# Altium footprint library HARTING THD.PcbLib: 113 footprints (part 1 of 11) (continued)
## HARTING_02 07 160 1101 [mm] "Extender Card Female Connector; Har-bus 64, 17mm Pres-in Terminations; Rows z+a+b+c+d, 160 Female Contacts" (continued)
  round 3.5 / inner round 3.5 / far side round 5.1 hole 2.8: MTG1(0,5.08) MTG2(0,-83.82)
Top Overlay:
  lines w0.2: -6.4,-83.82 -2.944,-83.82 -2.652,-83.314 ; -6.4,-80.77 -6.4,-86.37 -0.887,-86.37 ; -6.4,1.53 -6.4,7.63 -0.887,7.63 ; -6.4,5.08 -2.944,5.08 -2.652,4.574 ; -1.765,-81.777 -1.472,-81.27 -0.887,-81.27 ; -1.765,3.036 -1.472,2.53 -0.887,2.53 ; 0.887,-86.37 12.6,-86.37 ; 0.887,-81.27 1.472,-81.27 1.765,-81.777 ; 0.887,2.53 1.472,2.53 1.765,3.036 ; 0.887,7.63 12.6,7.63 ; 1.25,-80.77 1.25,2.03 12.6,2.03 ; 1.25,1.53 -12.6,1.53 -12.6,-80.77 12.6,-80.77 ; 2.579,-83.02 2.9,-83.02 2.9,-82.57 4.1,-81.37 4.1,-80.77 ; 2.579,4.28 2.9,4.28 2.9,3.83 4.1,2.63 4.1,2.03 ; 12,-80.77 12,2.03 ; 12.6,-81.87 25.57,-81.87 26.2,-81.24 26.2,2.5 25.57,3.13 12.6,3.13 ; 14.6,-86.67 12.6,-86.67 12.6,7.93 14.6,7.93 ; 15.1,-81.87 15.1,3.13 ; 16.55,-81.87 16.55,3.13 ; 18.5,-82.27 18.504,-82.27 cw(c18.504,-82.97) 19.204,-82.97 19.204,-84.37 ; 18.5,-81.87 18.5,-84.37 19.65,-84.37 19.65,-86.82 14.6,-86.82 14.6,8.08 19.65,8.08 19.65,5.63 18.5,5.63 18.5,3.13 ; 18.503,3.53 ccw(c18.503,4.23) 19.203,4.23 19.203,5.63 ; 25.9,-81.54 25.9,2.8
  text "d" at -10.705,2.175 h1.2
  text "c" at -8.13,2.2 h1.2
  text "1" at -13.8,-79.315 h1.2
  text "a" at -3.365,2.215 h1.2
  text "b" at -5.53,2.225 h1.2
  text "32" at -15.33,-0.615 h1.2
  text "5" at -14.255,-69.195 h1.2
  text "10" at -15.125,-56.505 h1.2
  text "15" at -15.125,-43.805 h1.2
  text "20" at -15.305,-31.115 h1.2
  text "25" at -15.355,-18.39 h1.2
  text "30" at -15.305,-5.69 h1.2
Mechanical 8:
  lines w0.1: -10.66,-78.74 -10.16,-78.74 ; -10.66,0 -10.16,0 ; -10.16,-79.24 -10.16,-78.74 ; -10.16,-78.24 -10.16,-78.74 ; -10.16,-0.5 -10.16,0 ; -10.16,0.5 -10.16,0 ; -9.66,-78.74 -10.16,-78.74 ; -9.66,0 -10.16,0 ; -8.12,-78.74 -7.62,-78.74 ; -8.12,0 -7.62,0 ; -7.62,-79.24 -7.62,-78.74 ; -7.62,-78.24 -7.62,-78.74 ; -7.62,-0.5 -7.62,0 ; -7.62,0.5 -7.62,0 ; -7.12,-78.74 -7.62,-78.74 ; -7.12,0 -7.62,0 ; -5.58,-78.74 -5.08,-78.74 ; -5.58,0 -5.08,0 ; -5.434,-39.724 -5.08,-39.37 ; -5.434,-39.016 -5.08,-39.37 ; -5.08,-79.24 -5.08,-78.74 ; -5.08,-78.24 -5.08,-78.74 ; -5.08,-0.5 -5.08,0 ; -5.08,0.5 -5.08,0 ; -4.726,-39.724 -5.08,-39.37 ; -4.726,-39.016 -5.08,-39.37 ; -4.58,-78.74 -5.08,-78.74 ; -4.58,0 -5.08,0 ; -3.04,-78.74 -2.54,-78.74 ; -3.04,0 -2.54,0 ; -2.54,-79.24 -2.54,-78.74 ; -2.54,-78.24 -2.54,-78.74 ; -2.54,-0.5 -2.54,0 ; -2.54,0.5 -2.54,0 ; -2.04,-78.74 -2.54,-78.74 ; -2.04,0 -2.54,0 ; -0.5,-83.82 0,-83.82 ; -0.5,-78.74 0,-78.74 ; -0.5,0 0,0 ; -0.5,5.08 0,5.08 ; 0,-84.32 0,-83.82 ; 0,-83.32 0,-83.82 ; 0,-79.24 0,-78.74 ; 0,-78.24 0,-78.74 ; 0,-0.5 0,0 ; 0,0.5 0,0 ; 0,4.58 0,5.08 ; 0,5.58 0,5.08 ; 0.5,-83.82 0,-83.82 ; 0.5,-78.74 0,-78.74 ; 0.5,0 0,0 ; 0.5,5.08 0,5.08 ; 2.76,-88.82 2.76,-39.37 2.76,10.08
Mechanical 14:
  circle w0.1: c0,-83.82 r1.25
  circle w0.1: c0,5.08 r1.25
  lines w0.1: -6.4,-83.82 -2.944,-83.82 -1.472,-81.27 1.472,-81.27 2.483,-83.02 2.9,-83.02 2.9,-82.57 4.1,-81.37 4.1,-80.77 ; -6.4,5.08 -2.944,5.08 -1.472,2.53 1.472,2.53 2.483,4.28 2.9,4.28 2.9,3.83 4.1,2.63 4.1,2.03 ; 1.25,-80.77 1.25,2.03 12.6,2.03 ; 1.25,1.53 -12.6,1.53 -12.6,-80.77 12.6,-80.77 ; 12,-80.77 12,2.03 ; 12.6,-86.37 -6.4,-86.37 -6.4,7.63 12.6,7.63 ; 12.6,-81.87 25.57,-81.87 26.2,-81.24 26.2,2.5 25.57,3.13 12.6,3.13 ; 14.6,-86.67 12.6,-86.67 12.6,7.93 14.6,7.93 ; 15.1,-81.87 15.1,3.13 ; 16.55,-81.87 16.55,3.13 ; 18.5,-82.27 18.504,-82.27 cw(c18.504,-82.97) 19.204,-82.97 19.204,-84.37 ; 18.5,-81.87 18.5,-84.37 19.65,-84.37 19.65,-86.82 14.6,-86.82 14.6,8.08 19.65,8.08 19.65,5.63 18.5,5.63 18.5,3.13 ; 18.503,3.53 ccw(c18.503,4.23) 19.203,4.23 19.203,5.63 ; 25.9,-81.54 25.9,2.8
  text "d" at -10.705,2.175 h1.2
  text "c" at -8.13,2.2 h1.2
  text "1" at -13.8,-79.315 h1.2
  text "z" at 1.7,-0.375 h1.2
  text "a" at -3.365,2.215 h1.2
  text "b" at -5.53,2.225 h1.2
  text "32" at -15.33,-0.615 h1.2
  text "5" at -14.255,-69.195 h1.2
  text "10" at -15.125,-56.505 h1.2
  text "15" at -15.125,-43.805 h1.2
  text "20" at -15.305,-31.115 h1.2
  text "25" at -15.355,-18.39 h1.2
  text "30" at -15.305,-5.69 h1.2
3D body "HARTING_02 07 160 1101.stp": height 11.95, standoff -4.05, extent -12.6,-86.82 26.2,8.08

## HARTING_02 44 000 0001 [mm] "Backplane Connector; Har-bus 64, Thru-Hole; Rows z+a+b+c+d, Press-in 160 Female Contacts"
height 15.5
Top Overlay:
  lines w0.2: -7.7,0.02 -6.9,0.02 ; -7.7,78.72 -6.9,78.72 ; -4.55,81.97 -4.55,86.87 ; -3,-8.13 -3,-0.53 2.4,-0.53 2.4,-8.13 ; -3,-7.549 -3.712,-7.549 -3.712,-4.711 -3,-4.711 ; -3,-3.23 -6.9,-3.23 -6.9,81.97 -3,81.97 ; -3,81.28 -3,86.87 ; -3,83.451 -3.712,83.451 -3.712,86.289 -3,86.289 ; -1.905,-8.13 -7.7,-8.13 -7.7,86.87 -1.905,86.87 ; 1.905,-8.13 7.7,-8.13 7.7,86.87 1.905,86.87 ; 2.4,-7.549 3.112,-7.549 3.109,-4.713 2.4,-4.711 ; 2.4,-3.23 4.4,-3.23 4.4,-2.23 6.9,-2.23 6.9,80.97 6.5,80.97 ; 2.4,81.28 2.4,86.87 ; 2.4,81.97 4.4,81.97 4.4,80.97 ; 2.4,83.451 3.112,83.451 3.103,86.281 2.4,86.281 ; 3.95,81.97 3.95,86.87 ; 6.9,0.02 7.7,0.02 ; 6.9,78.72 7.7,78.72
  text "5" at -9.17,9.485 h1.2
  text "b" at -0.425,79.915 h1.2
  text "a" at -3.14,79.905 h1.2
  text "z" at -5.725,79.89 h1.2
  text "c" at 2.275,79.94 h1.2
  text "d" at 5.15,79.915 h1.2
  text "30" at -10.6,73.025 h1.2
  text "25" at -10.6,60.325 h1.2
  text "20" at -10.6,47.625 h1.2
  text "15" at -10.6,34.925 h1.2
  text "10" at -10.6,22.225 h1.2
  text "32" at -10.6,78.105 h1.2
  text "1" at -9.07,-0.675 h1.2
Mechanical 8:
  lines w0.1: -1.3,-5.63 -0.3,-5.63 ; -1.3,84.37 -0.3,84.37 ; -0.5,0 0,0 ; -0.3,-6.63 -0.3,-5.63 ; -0.3,-4.63 -0.3,-5.63 ; -0.3,83.37 -0.3,84.37 ; -0.3,85.37 -0.3,84.37 ; 0,-0.5 0,0 ; 0,0.5 0,0 ; 0.5,0 0,0 ; 0.7,-5.63 -0.3,-5.63 ; 0.7,84.37 -0.3,84.37
Mechanical 14:
  lines w0.1: -7.7,0.02 -6.9,0.02 ; -7.7,78.72 -6.9,78.72 ; -4.55,81.97 -4.55,86.87 ; -3,-8.13 -3,-0.53 2.4,-0.53 2.4,-8.13 ; -3,-7.549 -3.712,-7.549 -3.712,-4.711 -3,-4.711 ; -3,-3.23 -6.9,-3.23 -6.9,81.97 -3,81.97 ; -3,83.451 -3.712,83.451 -3.712,86.289 -3,86.289 ; -3,85.87 2.4,85.87 ; -3,86.87 -3,79.27 2.4,79.27 2.4,86.87 ; 2.4,-7.549 3.112,-7.549 3.109,-4.713 2.4,-4.711 ; 2.4,-3.23 4.4,-3.23 4.4,-2.23 6.9,-2.23 6.9,80.97 4.4,80.97 4.4,81.97 2.4,81.97 ; 2.4,83.451 3.112,83.451 3.103,86.281 2.4,86.281 ; 3.95,81.97 3.95,86.87 ; 6.9,0.02 7.7,0.02 ; 6.9,78.72 7.7,78.72 ; -7.7,-8.13 7.7,-8.13 7.7,86.87 -7.7,86.87 -7.7,-8.13
  text "5" at -9.17,9.485 h1.2
  text "d" at 5.15,79.915 h1.2
  text "c" at 2.275,79.94 h1.2
  text "z" at -5.725,79.89 h1.2
  text "a" at -3.14,79.905 h1.2
  text "b" at -0.425,79.915 h1.2
  text "1" at -9.07,-0.675 h1.2
  text "32" at -10.6,78.105 h1.2
  text "10" at -10.6,22.225 h1.2
  text "15" at -10.6,34.925 h1.2
  text "20" at -10.6,47.625 h1.2
  text "25" at -10.6,60.325 h1.2
  text "30" at -10.6,73.025 h1.2
3D body "HARTING_02 44 000 0001.stp": height 15.5, standoff 0, extent -7.7,-8.13 7.7,86.87

## HARTING_02 44 000 0006 [mm] "Backplane Connector; Har-bus 64, Thru-Hole; Rows z+a+b+c+d, Press-in 160 Female Contacts"
height 12.5
Top Overlay:
  lines w0.2: -7.7,0.02 -6.9,0.02 ; -7.7,78.72 -6.9,78.72 ; -4.55,81.97 -4.55,86.87 ; -3,-8.13 -3,-0.53 2.4,-0.53 2.4,-8.13 ; -3,-7.549 -3.712,-7.549 -3.712,-4.711 -3,-4.711 ; -3,-3.23 -6.9,-3.23 -6.9,81.97 -3,81.97 ; -3,81.28 -3,86.87 ; -3,83.451 -3.712,83.451 -3.712,86.289 -3,86.289 ; -1.905,-8.13 -7.7,-8.13 -7.7,86.87 -1.905,86.87 ; 1.905,-8.13 7.7,-8.13 7.7,86.87 1.905,86.87 ; 2.4,-7.549 3.112,-7.549 3.109,-4.713 2.4,-4.711 ; 2.4,-3.23 4.4,-3.23 4.4,-2.23 6.9,-2.23 6.9,80.97 6.5,80.97 ; 2.4,81.28 2.4,86.87 ; 2.4,81.97 4.4,81.97 4.4,80.97 ; 2.4,83.451 3.112,83.451 3.103,86.281 2.4,86.281 ; 3.95,81.97 3.95,86.87 ; 6.9,0.02 7.7,0.02 ; 6.9,78.72 7.7,78.72
  text "b" at -0.425,79.915 h1.2
  text "a" at -3.14,79.905 h1.2
  text "z" at -5.725,79.89 h1.2
  text "c" at 2.275,79.94 h1.2
  text "d" at 5.15,79.915 h1.2
  text "1" at -9.07,-0.675 h1.2
  text "32" at -10.6,78.105 h1.2
  text "5" at -9.17,9.485 h1.2
  text "10" at -10.6,22.225 h1.2
  text "15" at -10.6,34.925 h1.2
  text "20" at -10.6,47.625 h1.2
  text "25" at -10.6,60.325 h1.2
  text "30" at -10.6,73.025 h1.2
Mechanical 8:
  lines w0.1: -1.3,-5.63 -0.3,-5.63 ; -1.3,84.37 -0.3,84.37 ; -0.5,0 0,0 ; -0.3,-6.63 -0.3,-5.63 ; -0.3,-4.63 -0.3,-5.63 ; -0.3,83.37 -0.3,84.37 ; -0.3,85.37 -0.3,84.37 ; 0,-0.5 0,0 ; 0,0.5 0,0 ; 0.5,0 0,0 ; 0.7,-5.63 -0.3,-5.63 ; 0.7,84.37 -0.3,84.37
Mechanical 14:
  lines w0.1: -7.7,0.02 -6.9,0.02 ; -7.7,78.72 -6.9,78.72 ; -4.55,81.97 -4.55,86.87 ; -3,-8.13 -3,-0.53 2.4,-0.53 2.4,-8.13 ; -3,-7.549 -3.712,-7.549 -3.712,-4.711 -3,-4.711 ; -3,-3.23 -6.9,-3.23 -6.9,81.97 -3,81.97 ; -3,83.451 -3.712,83.451 -3.712,86.289 -3,86.289 ; -3,85.87 2.4,85.87 ; -3,86.87 -3,79.27 2.4,79.27 2.4,86.87 ; 2.4,-7.549 3.112,-7.549 3.109,-4.713 2.4,-4.711 ; 2.4,-3.23 4.4,-3.23 4.4,-2.23 6.9,-2.23 6.9,80.97 4.4,80.97 4.4,81.97 2.4,81.97 ; 2.4,83.451 3.112,83.451 3.103,86.281 2.4,86.281 ; 3.95,81.97 3.95,86.87 ; 6.9,0.02 7.7,0.02 ; 6.9,78.72 7.7,78.72 ; -7.7,-8.13 7.7,-8.13 7.7,86.87 -7.7,86.87 -7.7,-8.13
  text "30" at -10.6,73.025 h1.2
  text "25" at -10.6,60.325 h1.2
  text "20" at -10.6,47.625 h1.2
  text "15" at -10.6,34.925 h1.2
  text "10" at -10.6,22.225 h1.2
  text "5" at -9.17,9.485 h1.2
  text "32" at -10.6,78.105 h1.2
  text "1" at -9.07,-0.675 h1.2
  text "d" at 5.15,79.915 h1.2
  text "c" at 2.275,79.94 h1.2
  text "z" at -5.725,79.89 h1.2
  text "a" at -3.14,79.905 h1.2
  text "b" at -0.425,79.915 h1.2
3D body "HARTING_02 44 000 0006.stp": height 12.5, standoff 0, extent -7.7,-8.13 7.7,86.87

## HARTING_09 02 164 2921 [mm] "Connector; DIN 41612, Type B, Thru-Hole; Rows a+b, 64 Position; Right Angle"
height 8.5
pads (66):
  round 1.7 hole 1: a1(0,0) a2(0,-2.54) a3(0,-5.08) a4(0,-7.62) a5(0,-10.16) a6(0,-12.7) a7(0,-15.24) a8(0,-17.78) a9(0,-20.32) a10(0,-22.86) a11(0,-25.4) a12(0,-27.94) a13(0,-30.48) a14(0,-33.02) a15(0,-35.56) a16(0,-38.1) a17(0,-40.64) a18(0,-43.18) a19(0,-45.72) a20(0,-48.26) a21(0,-50.8) a22(0,-53.34) a23(0,-55.88) a24(0,-58.42) a25(0,-60.96) a26(0,-63.5) a27(0,-66.04) a28(0,-68.58) a29(0,-71.12) a30(0,-73.66) a31(0,-76.2) a32(0,-78.74) b1(-2.54,0) b2(-2.54,-2.54) b3(-2.54,-5.08) b4(-2.54,-7.62) b5(-2.54,-10.16) b6(-2.54,-12.7) b7(-2.54,-15.24) b8(-2.54,-17.78) b9(-2.54,-20.32) b10(-2.54,-22.86) b11(-2.54,-25.4) b12(-2.54,-27.94) b13(-2.54,-30.48) b14(-2.54,-33.02) b15(-2.54,-35.56) b16(-2.54,-38.1) b17(-2.54,-40.64) b18(-2.54,-43.18) b19(-2.54,-45.72) b20(-2.54,-48.26) b21(-2.54,-50.8) b22(-2.54,-53.34) b23(-2.54,-55.88) b24(-2.54,-58.42) b25(-2.54,-60.96) b26(-2.54,-63.5) b27(-2.54,-66.04) b28(-2.54,-68.58) b29(-2.54,-71.12) b30(-2.54,-73.66) b31(-2.54,-76.2) b32(-2.54,-78.74)
  round 3.5 / inner round 3.5 / far side round 5.1 hole 2.8: MTG1(2.54,5.08) MTG2(2.54,-83.82)
Top Overlay:
  drawing of 227 lines, arcs and shapes, not listed
  text "30" at -5.98,-74.285 h1.2
  text "25" at -6,-61.575 h1.2
  text "20" at -6.055,-48.81 h1.2
  text "15" at -5.83,-36.235 h1.2
  text "10" at -5.83,-23.535 h1.2
  text "5" at -4.855,-10.785 h1.2
  text "32" at -5.955,-79.365 h1.2
  text "a" at -0.95,1.99 h1.2
  text "b" at -2.65,2.025 h1.2
  text "1" at -4.505,-0.725 h1.2
Mechanical 8:
  lines w0.1: -5.08,-39.37 12.64,-39.37 ; 5.3,-86.3 5.3,7.5
  text "PCB" at 5.08,-41.275 h1.2
Mechanical 14:
  drawing of 161 lines, arcs and shapes, not listed
  text "5" at -4.855,-10.785 h1.2
  text "1" at -4.505,-0.725 h1.2
  text "30" at -5.98,-74.285 h1.2
  text "20" at -6.055,-48.81 h1.2
  text "10" at -5.83,-23.535 h1.2
  text "32" at -5.955,-79.365 h1.2
  text "b" at -2.65,2.025 h1.2
  text "a" at -0.95,1.99 h1.2
3D body "HARTING_09 02 164 2921.stp": height 6.83, standoff -3, extent -2.838,-86.37 12.642,7.63

## HARTING_09 02 264 6825 [mm] "DIN 41612, Type B, Thru-Hole; Rows a+b, 64 Position, Straight Female Connector"
height 11.6
pads (66):
  round 1.7 hole 1: a1(0,0) a2(0,-2.54) a3(0,-5.08) a4(0,-7.62) a5(0,-10.16) a6(0,-12.7) a7(0,-15.24) a8(0,-17.78) a9(0,-20.32) a10(0,-22.86) a11(0,-25.4) a12(0,-27.94) a13(0,-30.48) a14(0,-33.02) a15(0,-35.56) a16(0,-38.1) a17(0,-40.64) a18(0,-43.18) a19(0,-45.72) a20(0,-48.26) a21(0,-50.8) a22(0,-53.34) a23(0,-55.88) a24(0,-58.42) a25(0,-60.96) a26(0,-63.5) a27(0,-66.04) a28(0,-68.58) a29(0,-71.12) a30(0,-73.66) a31(0,-76.2) a32(0,-78.74) b1(2.54,0) b2(2.54,-2.54) b3(2.54,-5.08) b4(2.54,-7.62) b5(2.54,-10.16) b6(2.54,-12.7) b7(2.54,-15.24) b8(2.54,-17.78) b9(2.54,-20.32) b10(2.54,-22.86) b11(2.54,-25.4) b12(2.54,-27.94) b13(2.54,-30.48) b14(2.54,-33.02) b15(2.54,-35.56) b16(2.54,-38.1) b17(2.54,-40.64) b18(2.54,-43.18) b19(2.54,-45.72) b20(2.54,-48.26) b21(2.54,-50.8) b22(2.54,-53.34) b23(2.54,-55.88) b24(2.54,-58.42) b25(2.54,-60.96) b26(2.54,-63.5) b27(2.54,-66.04) b28(2.54,-68.58) b29(2.54,-71.12) b30(2.54,-73.66) b31(2.54,-76.2) b32(2.54,-78.74)
  round 3.5 / inner round 3.5 / far side round 5.1 hole 2.8: MTG1(2.24,5.63) MTG2(2.24,-84.37)
Top Overlay:
  lines w0.2: -2.73,-84.37 -0.71,-84.37 ; -2.73,5.63 -0.71,5.63 ; -1.08,-79.8 -1.08,-81.22 ; -1.08,1.06 -1.08,2.48 ; -0.71,-86.82 -0.71,-83.82 0.416,-81.87 ; -0.71,8.08 -0.71,5.08 0.416,3.13 ; 1.275,-86.82 -2.73,-86.82 -2.73,8.08 1.275,8.08 ; 3.2,-86.82 5.27,-86.82 5.27,8.08 3.2,8.08 ; 3.62,-79.375 3.62,-80.17 ; 3.62,0.635 3.62,1.43 ; 4.693,-82.82 5.27,-82.82 ; 4.693,4.075 5.27,4.075 ; -1.73,-81.87 -1.08,-81.22 ; -1.73,-81.87 -1.73,3.13 ; -1.73,-81.87 1.17,-81.87 ; -1.73,3.13 -1.08,2.48 ; -1.73,3.13 1.17,3.13 ; -1.08,-81.22 0.52,-81.22 ; -1.08,2.48 0.52,2.48 ; 0.52,-81.22 1.17,-81.87 ; 0.52,-81.22 0.52,-80.17 ; 0.52,-80.17 1.17,-80.82 ; 0.52,-80.17 3.62,-80.17 ; 0.52,1.43 1.17,2.08 ; 0.52,1.43 0.52,2.48 ; 0.52,1.43 3.62,1.43 ; 0.52,2.48 1.17,3.13 ; 1.17,-81.87 1.17,-80.82 ; 1.17,-80.82 4.27,-80.82 ; 1.17,2.08 4.27,2.08 ; 1.17,2.08 1.17,3.13 ; 3.62,-80.17 4.27,-80.82 ; 3.62,1.43 4.27,2.08 ; 4.27,-80.82 4.27,2.08
  text "b" at 5.945,-0.574 h1.2
  text "a" at -2.001,3.81 h1.2
  text "32" at -5.575,-79.44 h1.2
  text "5" at -4.35,-10.91 h1.2
  text "10" at -5.275,-23.56 h1.2
  text "30" at -5.575,-74.36 h1.2
  text "25" at -5.575,-61.66 h1.2
  text "20" at -5.575,-48.96 h1.2
  text "15" at -5.275,-36.26 h1.2
  text "1" at -4.15,-0.75 h1.2
Mechanical 8:
  drawing of 262 lines, arcs and shapes, not listed
Mechanical 14:
  lines w0.1: -2.73,-84.37 -0.71,-84.37 ; -2.73,5.63 -0.71,5.63 ; -0.71,-86.82 -0.71,-83.82 0.416,-81.87 ; -0.71,8.08 -0.71,5.08 0.416,3.13 ; 5.27,-82.82 4.693,-82.82 4.144,-81.87 -1.73,-81.87 ; 5.27,4.08 4.693,4.08 4.144,3.13 -1.73,3.13 ; -1.73,-81.87 -1.08,-81.22 ; -1.73,-81.87 -1.73,3.13 ; -1.73,3.13 -1.08,2.48 ; -1.08,-81.22 -1.08,2.48 ; -1.08,-81.22 0.52,-81.22 ; -1.08,2.48 0.52,2.48 ; 0.52,-81.22 1.17,-81.87 1.17,-80.82 ; 0.52,-81.22 0.52,-80.17 ; 0.52,-80.17 1.17,-80.82 ; 0.52,-80.17 3.62,-80.17 ; 0.52,1.43 1.17,2.08 ; 0.52,1.43 0.52,2.48 ; 0.52,1.43 3.62,1.43 ; 0.52,2.48 1.17,3.13 1.17,2.08 ; 1.17,-80.82 4.27,-80.82 ; 1.17,2.08 4.27,2.08 ; 3.62,-80.17 4.27,-80.82 ; 3.62,-80.17 3.62,1.43 ; 3.62,1.43 4.27,2.08 ; 4.27,-80.82 4.27,2.08 ; -2.73,-86.82 -2.73,8.08 5.27,8.08 5.27,-86.82 -2.73,-86.82
  text "1" at -4.15,-0.75 h1.2
  text "b" at 5.945,-0.574 h1.2
  text "a" at -2.001,3.81 h1.2
  text "32" at -5.575,-79.44 h1.2
  text "5" at -4.35,-10.91 h1.2
  text "10" at -5.275,-23.56 h1.2
  text "15" at -5.275,-36.26 h1.2
  text "20" at -5.575,-48.96 h1.2
  text "25" at -5.575,-61.66 h1.2
  text "30" at -5.575,-74.36 h1.2
3D body "HARTING_09 02 264 6825.stp": height 11.6, standoff -4.5, extent -2.73,-86.82 5.27,8.08

## HARTING_09 02 264 6850 [mm] "DIN 41612, Type B, Thru-Hole Press-in; Rows a+b, 64 Position, Straight Female Connector"
height 11.6
pads (66):
  round 1.7 hole 1: a1(0,0) a2(0,-2.54) a3(0,-5.08) a4(0,-7.62) a5(0,-10.16) a6(0,-12.7) a7(0,-15.24) a8(0,-17.78) a9(0,-20.32) a10(0,-22.86) a11(0,-25.4) a12(0,-27.94) a13(0,-30.48) a14(0,-33.02) a15(0,-35.56) a16(0,-38.1) a17(0,-40.64) a18(0,-43.18) a19(0,-45.72) a20(0,-48.26) a21(0,-50.8) a22(0,-53.34) a23(0,-55.88) a24(0,-58.42) a25(0,-60.96) a26(0,-63.5) a27(0,-66.04) a28(0,-68.58) a29(0,-71.12) a30(0,-73.66) a31(0,-76.2) a32(0,-78.74) b1(2.54,0) b2(2.54,-2.54) b3(2.54,-5.08) b4(2.54,-7.62) b5(2.54,-10.16) b6(2.54,-12.7) b7(2.54,-15.24) b8(2.54,-17.78) b9(2.54,-20.32) b10(2.54,-22.86) b11(2.54,-25.4) b12(2.54,-27.94) b13(2.54,-30.48) b14(2.54,-33.02) b15(2.54,-35.56) b16(2.54,-38.1) b17(2.54,-40.64) b18(2.54,-43.18) b19(2.54,-45.72) b20(2.54,-48.26) b21(2.54,-50.8) b22(2.54,-53.34) b23(2.54,-55.88) b24(2.54,-58.42) b25(2.54,-60.96) b26(2.54,-63.5) b27(2.54,-66.04) b28(2.54,-68.58) b29(2.54,-71.12) b30(2.54,-73.66) b31(2.54,-76.2) b32(2.54,-78.74)
  round 3.5 / inner round 3.5 / far side round 5.1 hole 2.8: MTG1(2.24,5.63) MTG2(2.24,-84.37)
Top Overlay:
  lines w0.2: -2.73,-84.37 -0.71,-84.37 ; -2.73,5.63 -0.71,5.63 ; -1.08,-79.8 -1.08,-81.22 ; -1.08,1.06 -1.08,2.48 ; -0.71,-86.82 -0.71,-83.82 0.416,-81.87 ; -0.71,8.08 -0.71,5.08 0.416,3.13 ; 1.275,-86.82 -2.73,-86.82 -2.73,8.08 1.275,8.08 ; 3.2,-86.82 5.27,-86.82 5.27,8.08 3.2,8.08 ; 3.62,-79.375 3.62,-80.17 ; 3.62,0.635 3.62,1.43 ; 4.693,-82.82 5.27,-82.82 ; 4.693,4.075 5.27,4.075 ; -1.73,-81.87 1.17,-81.87 ; -1.73,-81.87 -1.73,3.13 ; -1.73,-81.87 -1.08,-81.22 ; -1.73,3.13 1.17,3.13 ; -1.73,3.13 -1.08,2.48 ; -1.08,-81.22 0.52,-81.22 ; -1.08,2.48 0.52,2.48 ; 0.52,-81.22 0.52,-80.17 ; 0.52,-81.22 1.17,-81.87 ; 0.52,-80.17 3.62,-80.17 ; 0.52,-80.17 1.17,-80.82 ; 0.52,1.43 3.62,1.43 ; 0.52,1.43 0.52,2.48 ; 0.52,1.43 1.17,2.08 ; 0.52,2.48 1.17,3.13 ; 1.17,-81.87 1.17,-80.82 ; 1.17,-80.82 4.27,-80.82 ; 1.17,2.08 1.17,3.13 ; 1.17,2.08 4.27,2.08 ; 3.62,-80.17 4.27,-80.82 ; 3.62,1.43 4.27,2.08 ; 4.27,-80.82 4.27,2.08
  text "a" at -2.051,3.86 h1.2
  text "1" at -4.175,-0.75 h1.2
  text "15" at -5.3,-36.26 h1.2
  text "20" at -5.6,-48.96 h1.2
  text "25" at -5.6,-61.66 h1.2
  text "30" at -5.6,-74.36 h1.2
  text "10" at -5.3,-23.56 h1.2
  text "5" at -4.375,-10.91 h1.2
  text "32" at -5.6,-79.44 h1.2
Mechanical 8:
  drawing of 262 lines, arcs and shapes, not listed
Mechanical 14:
  lines w0.1: -2.73,-84.37 -0.71,-84.37 ; -2.73,5.63 -0.71,5.63 ; -0.71,-86.82 -0.71,-83.82 0.416,-81.87 ; -0.71,8.08 -0.71,5.08 0.416,3.13 ; 5.27,-82.82 4.693,-82.82 4.144,-81.87 -1.73,-81.87 ; 5.27,4.08 4.693,4.08 4.144,3.13 -1.73,3.13 ; -1.73,-81.87 -1.73,3.13 ; -1.73,-81.87 -1.08,-81.22 ; -1.73,3.13 -1.08,2.48 ; -1.08,-81.22 0.52,-81.22 ; -1.08,-81.22 -1.08,2.48 ; -1.08,2.48 0.52,2.48 ; 0.52,-81.22 0.52,-80.17 ; 0.52,-81.22 1.17,-81.87 1.17,-80.82 ; 0.52,-80.17 3.62,-80.17 ; 0.52,-80.17 1.17,-80.82 ; 0.52,1.43 3.62,1.43 ; 0.52,1.43 0.52,2.48 ; 0.52,1.43 1.17,2.08 ; 0.52,2.48 1.17,3.13 1.17,2.08 ; 1.17,-80.82 4.27,-80.82 ; 1.17,2.08 4.27,2.08 ; 3.62,-80.17 3.62,1.43 ; 3.62,-80.17 4.27,-80.82 ; 3.62,1.43 4.27,2.08 ; 4.27,-80.82 4.27,2.08 ; -2.73,-86.82 5.27,-86.82 5.27,8.08 -2.73,8.08 -2.73,-86.82
  text "a" at -2.051,3.86 h1.2
  text "30" at -5.6,-74.36 h1.2
  text "25" at -5.6,-61.66 h1.2
  text "20" at -5.6,-48.96 h1.2
  text "15" at -5.3,-36.26 h1.2
  text "10" at -5.3,-23.56 h1.2
  text "5" at -4.375,-10.91 h1.2
  text "32" at -5.6,-79.44 h1.2
  text "1" at -4.175,-0.75 h1.2
Drill Drawing:
  lines w0.1: -1.83,-59.13 -1.83,-80.17 4.25,-80.17 4.25,1.43 -1.73,1.43 -1.73,-21.03
  text "PRESS-FIT TECHNOLOGY diam. 1mm +0.1 -0" at -1.315,-57.225 h1
3D body "HARTING_09 02 264 6850.stp": height 11.6, standoff -4.5, extent -2.73,-86.82 5.27,8.08

## HARTING_09 03 000 6104 [mm] "DIN-41612  Type M, 20A Special Power Male Contacts"
height 6.5
pads (4):
  round 1.7 hole 1: 1(-2.54,-2.54) 1(-2.54,2.54) 1(2.54,-2.54) 1(2.54,2.54)
Top Overlay:
  lines w0.2: -3.06,-1.403 -3.06,1.403 ; -1.378,-3 1.13,-3 ; -1.378,3 1.13,3
Mechanical 8:
  lines w0.1: -3.04,-2.54 -2.54,-2.54 ; -3.04,2.54 -2.54,2.54 ; -2.54,-3.04 -2.54,-2.54 ; -2.54,-2.04 -2.54,-2.54 ; -2.54,2.04 -2.54,2.54 ; -2.54,3.04 -2.54,2.54 ; -2.04,-2.54 -2.54,-2.54 ; -2.04,2.54 -2.54,2.54 ; -0.5,0 0,0 ; 0,-0.5 0,0 ; 0,0.5 0,0 ; 0.5,0 0,0 ; 2.04,-2.54 2.54,-2.54 ; 2.04,2.54 2.54,2.54 ; 2.54,-3.04 2.54,-2.54 ; 2.54,-2.04 2.54,-2.54 ; 2.54,2.04 2.54,2.54 ; 2.54,3.04 2.54,2.54 ; 3.04,-2.54 2.54,-2.54 ; 3.04,2.54 2.54,2.54
Mechanical 14:
  lines w0.1: 2.84,-2.4 5.06,-2.4 5.06,2.4 2.84,2.4 ; 5.06,-1.8 5.14,-1.8 ; 5.06,1.8 5.14,1.8 ; 7.61,-1.8 7.64,-1.8 ; 7.61,1.8 7.64,1.8 ; 8.153,-1.8 13.226,-1.8 13.933,-1.507 14.64,-0.8 14.64,0.8 13.933,1.507 13.226,1.8 8.153,1.8 ; 7.908,-2.375 7.908,2.375 ; 7.908,-2.375 7.64,-2.375 7.64,2.375 7.908,2.375 ; 7.908,-2.375 8.153,-1.95 8.153,1.95 7.908,2.375 ; -3.06,-3 -3.06,3 2.84,3 2.84,-3 -3.06,-3 ; 5.14,-2.402 5.94,-2.402 7.61,-2.06 7.61,2.23 5.94,2.6 5.14,2.6 5.14,-2.402
3D body "HARTING_09 03 000 6104.stp": height 6.5, standoff -3.2, extent -3.06,-3 14.64,3

## HARTING_09 03 000 6140 [mm] "DIN-41612 Type M, 2.8kV Special High Voltage Straight Male Contact"
height 18.75
Top Overlay:
  circle w0.2: c0,0 r3.3
Mechanical 8:
  circle w0.1: c0,0 r1.5
  lines w0.1: -0.5,0 0,0 ; 0,-0.5 0,0 ; 0,0.5 0,0 ; 0.5,0 0,0
Mechanical 14:
  circle w0.1: c0,0 r2.75
  circle w0.1: c0,0 r2.75
  circle w0.1: c0,0 r0.5
3D body "HARTING_09 03 000 6140.stp": height 11.2, standoff -7.4, extent -2.728,-2.744 2.75,2.745

## HARTING_09 03 000 6140_a [mm] "DIN-41612 Type M, 2.8kV Special High Voltage Straight Male Contact"
height 18.75
Top Overlay:
  lines w0.2: -3.22,-0.238 ccw(c-4.511,-3.306) -4.12,0 -4.12,0.8 -3.22,0.8 ; 1.53,-2.4 -3.22,-2.4 -3.22,2.4 1.53,2.4
Mechanical 8:
  lines w0.1: -0.5,0 0,0 0,-0.5
Mechanical 14:
  lines w0.1: -3.22,-0.238 ccw(c-4.511,-3.306) -4.12,0 -4.12,0.8 -3.22,0.8 ; 1.78,-2.4 -3.22,-2.4 -3.22,2.4 1.78,2.4 ; 2.88,-2.4 5.1,-2.4 5.1,2.4 2.88,2.4 ; 5.1,-1.45 5.18,-1.45 ; 5.1,1.45 5.18,1.45 ; 7.65,-1.45 7.68,-1.45 ; 7.65,1.45 7.68,1.45 ; 5.98,-2.6 5.98,2.6 ; 5.98,-2.6 5.18,-2.6 5.18,2.6 5.98,2.6 ; 5.98,-2.6 7.65,-2.23 7.65,2.23 5.98,2.6 ; 5.98,-2.6 5.98,2.6 ; 1.78,-2.75 2.88,-2.75 2.88,2.75 1.78,2.75 1.78,-2.75 ; 7.68,-2.375 7.68,2.375 14.48,2.375 14.48,-2.375 7.68,-2.375
3D body "HARTING_09 03 000 6140_a.stp": height 6.6, standoff 1.1, extent -4.12,-2.74 14.48,2.741

## HARTING_09 03 000 6202 [mm] "DIN-41612  Type M, 20A Special Power Straight Female Contact"
height 11
Top Overlay:
  circle w0.2: c0,0 r3.3
Mechanical 8:
  lines w0.1: -0.5,0 0,0 ; 0,-0.5 0,0 ; 0,0.5 0,0 ; 0.5,0 0,0
Mechanical 14:
  circle w0.1: c0,0 r2.8
3D body "HARTING_09 03 000 6202.stp": height 10.9, standoff -10.45, extent -2.8,-2.794 2.778,2.795

## HARTING_09 03 000 6225 [mm] "DIN-41612  Type M, 20A Special Power Female Contact"
height 12.6
pads (1):
  round 3.7 hole 3: 1(0,0)
Top Overlay:
  circle w0.2: c0,0 r2.75
Mechanical 14:
  circle w0.1: c0,0 r2.75
3D body "HARTING_09 03 000 6225.stp": height 10.3, standoff -5.2, extent -2.728,-2.744 2.75,2.745

## HARTING_09 03 000 6240 [mm] "DIN-41612  Type M, 2.8kV Special High Voltage  Female Contacts"
height 5.6
Top Overlay:
  lines w0.2: -3.32,-0.8 -4.22,-0.8 -4.22,0.8 -3.32,0.8 ; 1.13,-2.4 -3.32,-2.4 -3.32,2.4 1.13,2.4
Mechanical 8:
  lines w0.1: -0.5,0 0,0 ; 0,-0.5 0,0 ; 0,0.5 0,0 ; 0.5,0 0,0
Mechanical 14:
  lines w0.1: -3.32,-0.8 -4.22,-0.8 -4.22,0.8 -3.32,0.8 ; 1.68,-2.4 -3.32,-2.4 -3.32,2.4 1.68,2.4 ; 2.88,-2.4 5.1,-2.4 5.1,2.4 2.88,2.4 ; 5.1,-1.5 5.18,-1.5 ; 5.1,1.5 5.18,1.5 ; 5.98,-2.402 5.98,2.6 ; 5.98,-2.402 5.18,-2.402 5.18,2.6 5.98,2.6 ; 5.98,-2.402 7.65,-2.06 7.65,2.23 5.98,2.6 ; 8.13,-2.375 8.58,-1.825 ; 8.13,-2.375 7.68,-2.375 7.68,2.375 8.13,2.375 ; 8.13,-2.375 8.13,2.375 ; 8.13,2.375 8.58,1.825 ; 8.58,-1.825 8.58,1.825 ; 8.58,-1.825 14.18,-1.825 14.38,-1.625 14.38,1.625 14.18,1.825 8.58,1.825 ; 1.68,-2.8 1.68,2.8 2.88,2.8 2.88,-2.8 1.68,-2.8
3D body "HARTING_09 03 000 6240.stp": height 6.65, standoff 1.05, extent -4.22,-2.8 14.38,2.8